# Altium footprint library Component.PcbLib: 47 footprints (part 1 of 3)
Each footprint in its own frame and in the unit in brackets; x right, y up, seen from the top. Pads: shape width x height; smd on the part's side, far side on the other; paste and mask are expansions set on the pad; w line width, h text height; cw(c..) or ccw(c..) is an arc to the next point about the centre after c.
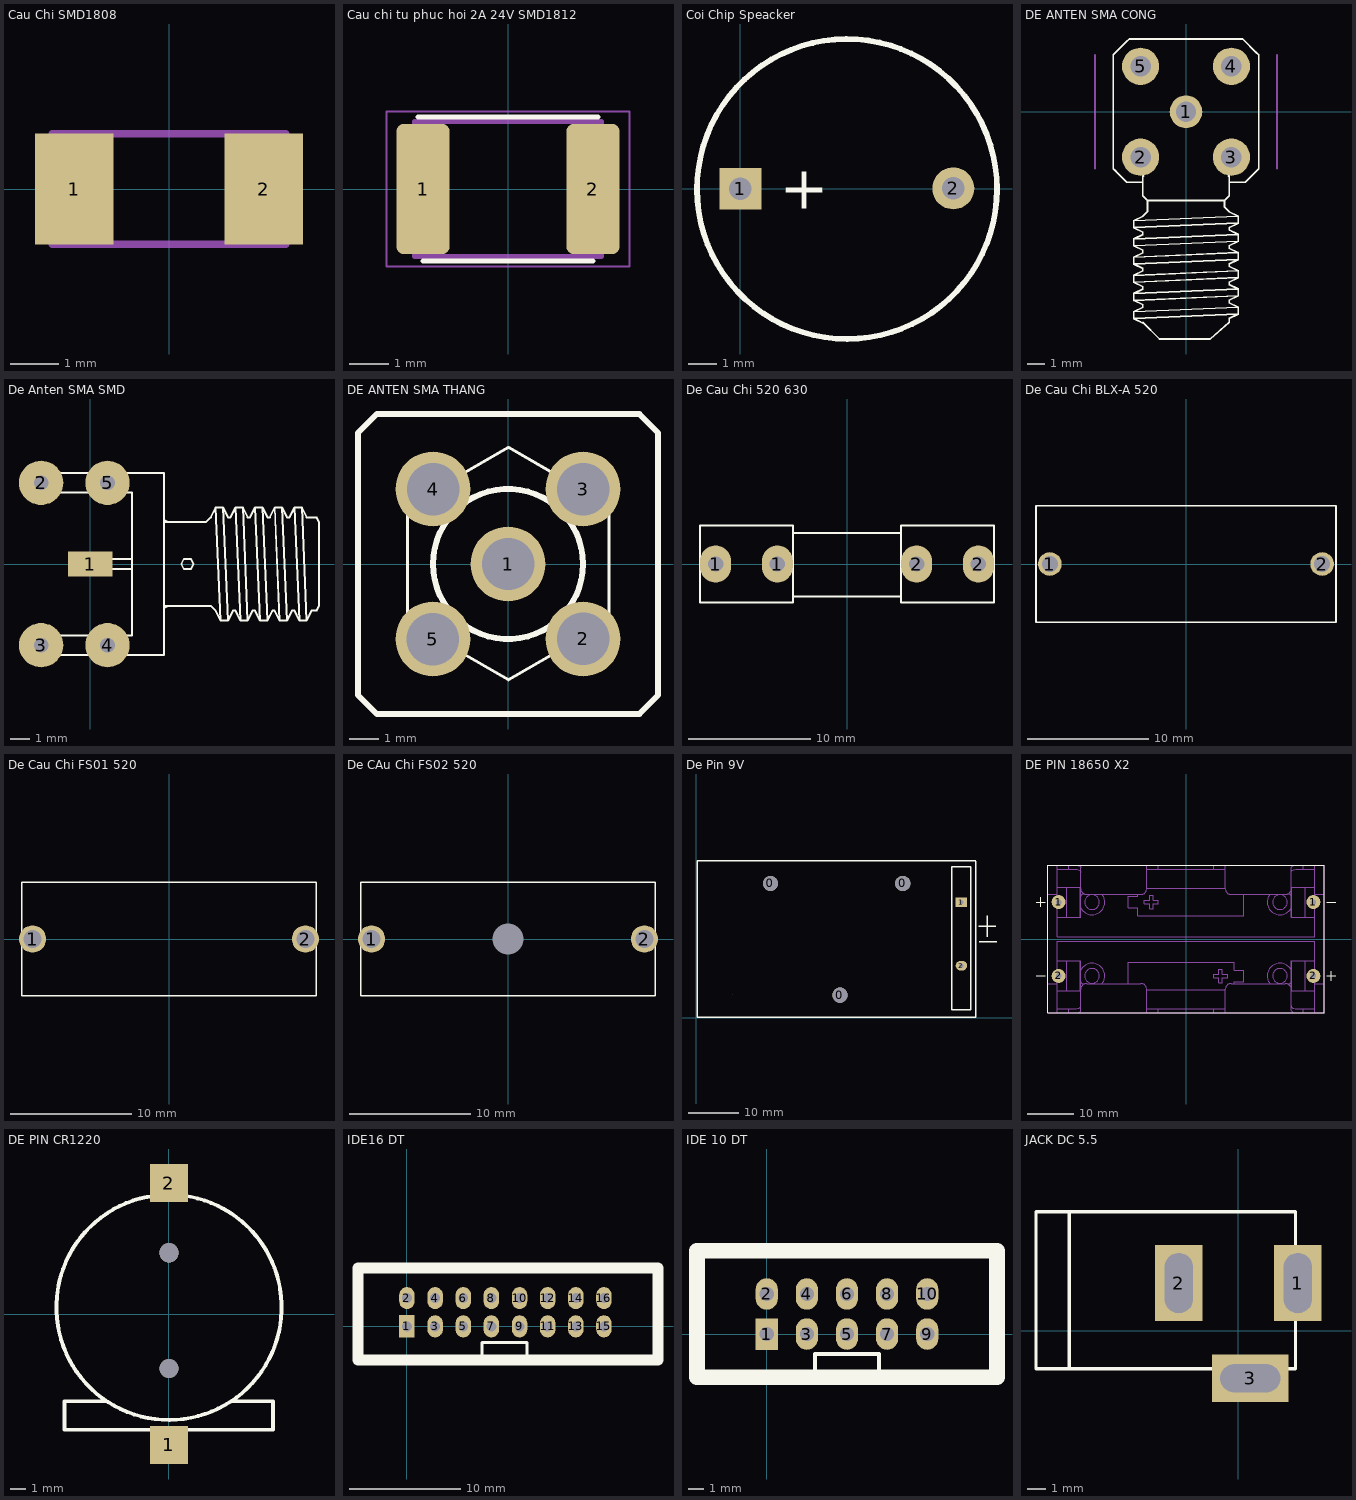
[diagram p0: the footprints below, top view; thin cyan lines are the x and y axes]

## Cau Chi SMD1808 [mil]
pads (2):
  rect 64x90 smd: 1(-77,0) 2(77,0)
Mechanical 13:
  lines w6: -55,-45 -55,45 ; -55,-45 -95,-45 -95,45 -55,45 ; -55,-45 55,-45 ; -55,45 55,45 ; 55,-45 55,45 ; 55,-45 95,-45 95,45 55,45
3D body "User Library-SMD Ceramic Capacitors_1808 (4520)_LF.STEP": height 39.37, standoff 0, extent -90.79,-39.36 90.8,39.38

## Cau chi tu phuc hoi 2A 24V SMD1812 [mm]
pads (2):
  rrect25% 1.34x3.29 smd: 1(-2.15,0) 2(2.15,0)
Top Overlay:
  lines w0.127: -2.28,1.825 2.28,1.825 ; -2.15,-1.825 2.15,-1.825
Mechanical 13:
  lines w0.127: -2.37,-1.71 2.37,-1.71 2.37,1.71 -2.37,1.71 -2.37,-1.71
Mechanical 15:
  lines w0.05: -3.07,-1.96 3.07,-1.96 3.07,1.96 -3.07,1.96 -3.07,-1.96
3D body "step_temp.STEP": height 1.25, standoff 0, extent -2.275,-1.62 2.275,1.62

## Coi Chip Speacker [mm]
pads (2):
  rect 1.5x1.5 hole 0.8: 1(0,0)
  round 1.5 hole 0.8: 2(7.62,0.013)
Top Overlay:
  lines w0.203: 7.724,3.67 ccw(c3.816,-0.008) 7.76,3.632
  text "+" at 1.41,-0.711 h1.52
3D body "User Library-Buzzer WST-1203UX.step": height 4.5, standoff -9.65, extent -2.215,-6 13.239,6

## DE ANTEN SMA CONG [mil]
pads (5):
  round 72 hole 45: 1(0,0)
  round 82 hole 45: 2(-100,-100) 3(100,-100) 4(100,100) 5(-100,100)
Top Overlay:
  lines w4: -155,-130 -160,-125 ; -95,-465 -115,-455 ; -95,-463.33 -58.33,-500 53.33,-500 95,-463.33 95,-455 115,-445 ; -95,-155 -130,-155 -160,-125 ; -93.33,-141.67 -95,-140 -95,-185 -85,-195 ; 93.33,-141.67 95,-140 95,-185 85,-195 ; 95,-155 130,-155 160,-125 160,80 ; 160,75 160,125 155,130 125,160 -125,160 -130,155 -160,125 -160,-125 ; -115,-455 -115,-440 ; -115,-455 115,-445 ; -115,-440 -95,-430 -95,-425 -115,-415 ; -115,-440 115,-430 ; -115,-415 -115,-400 ; -115,-415 115,-405 ; -115,-400 -95,-390 -95,-385 -115,-375 ; -115,-400 115,-390 ; -115,-375 -115,-360 ; -115,-375 115,-365 ; -115,-360 -95,-350 -95,-345 -115,-335 ; -115,-360 115,-350 ; -115,-335 -115,-320 ; -115,-335 115,-325 ; -115,-320 -95,-310 -95,-305 -115,-295 ; -115,-320 115,-310 ; -115,-295 -115,-280 ; -115,-295 115,-285 ; -115,-280 -95,-270 -95,-265 -115,-255 ; -115,-280 115,-270 ; -115,-255 -115,-240 ; -115,-255 115,-245 ; -115,-240 -95,-230 -85,-220 -85,-210 -85,-200 -85,-195 ; -115,-240 115,-230 ; -85,-195 85,-195 ; 85,-195 85,-200 85,-210 95,-220 115,-230 ; 115,-445 115,-430 ; 115,-430 95,-420 95,-415 115,-405 ; 115,-405 115,-390 ; 115,-390 95,-380 95,-375 115,-365 ; 115,-365 115,-350 ; 115,-350 95,-340 95,-335 115,-325 ; 115,-325 115,-310 ; 115,-310 95,-300 95,-295 115,-285 ; 115,-285 115,-270 ; 115,-270 95,-260 95,-255 115,-245 ; 115,-245 115,-230
Mechanical 1:
  lines w4: -200,-125 -200,125 ; 200,-125 200,125
3D body "SMA-J-P-X-RA-TH1.step": height 394.06, standoff -149.25, extent -136.5,-457.49 139.09,137

## De Anten SMA SMD [mil]
pads (5):
  rect 90x50 smd: 1(0,0)
  round 90 hole 30: 2(-100,165) 3(-100,-165) 4(35,-165) 5(35,165)
Top Overlay:
  lines w4: 10,-10 85,-10 ; 10,10 85,10 ; 150,-90 160,-85 ; 150,-85 200,-85 220,-85 225,-85 235,-85 245,-85 255,-95 265,-115 ; 150,85 200,85 220,85 225,85 235,85 245,95 255,115 ; 150,90 160,85 ; 255,115 270,115 ; 255,115 265,-115 ; 265,-115 280,-115 ; 270,115 280,95 285,95 ; 270,115 280,-115 ; 280,-115 290,-95 ; 285,95 295,115 ; 285,95 295,115 ; 290,-95 295,-95 ; 290,-95 295,-95 ; 295,-95 305,-115 ; 295,115 310,115 ; 295,115 305,-115 ; 305,-115 320,-115 ; 310,115 320,95 325,95 335,115 ; 310,115 320,-115 ; 320,-115 330,-95 335,-95 345,-115 ; 335,115 350,115 ; 335,115 345,-115 ; 345,-115 360,-115 ; 350,115 360,95 365,95 375,115 ; 350,115 360,-115 ; 360,-115 370,-95 375,-95 385,-115 ; 375,115 390,115 ; 375,115 385,-115 ; 385,-115 400,-115 ; 390,115 400,95 405,95 415,115 ; 390,115 400,-115 ; 400,-115 410,-95 415,-95 425,-115 ; 415,115 430,115 ; 415,115 425,-115 ; 425,-115 440,-115 ; 430,115 440,95 448.33,95 460,95 465,85 465,53.33 465,-58.33 465,-85 460,-95 450,-95 440,-115 ; 430,115 440,-115 ; -100,-185 -100,-145 85,-145 85,145 -100,145 -100,185 65,185 85,185 150,185 150,-185 -100,-185 ; 185,0 190,10 205,10 210,0 205,-10 190,-10 185,0
3D body "sma-endlaunch-wide.step": height 155.91, standoff -155.91, extent -103.24,-186 441.24,188.8

## DE ANTEN SMA THANG [mil]
pads (5):
  round 100 hole 70: 1(0,0) 2(100,-100) 3(100,100) 4(-100,100) 5(-100,-100)
Top Overlay:
  circle w8: c0,0 r100
  circle w8: c0,0 r25
  lines w4: -133.69,-76.91 -133.69,78.09 0.55,155.59 134.78,78.09 134.78,-76.91 0.55,-154.41 -133.69,-76.91
  lines w8: -200,-175 -175,-200 175,-200 200,-175 200,175 175,200 -175,200 -200,175 -200,150 -200,-175
3D body "SMA-J-P-X-ST-TH1.step": height 385.54, standoff -145.95, extent -138.3,-136.09 137.3,139.5

## De Cau Chi 520 630 [mil] "De Fuse"
pads (4):
  oval 100x120 hole 50: 1(-425,0) 1(-225,0) 2(225,0) 2(425,0)
Top Overlay:
  lines w7: -175,-105 175,-105 ; -175,100 175,100 ; -475,-125 -175,-125 -175,125 -475,125 -475,-125 ; 175,-125 175,125 475,125 475,-125 175,-125
3D body "SW3dPS-Fuse Leg_2009.STEP": height 377.88, standoff -129.94, extent -448,-117 -208,126.71
3D body "SW3dPS-Fuse Small 1A.STEP": height 370.39, standoff 169.61, extent -384.8,-98 390.8,102.79
3D body "SW3dPS-Fuse Leg_2009.STEP": height 377.88, standoff -129.94, extent 219,-116.71 459,127

## De Cau Chi BLX-A 520 [mm] "PCB - Clip Cover - THR"
height 12.6
pads (2):
  round 1.95 hole 1.3: 1(-11.25,0) 2(11.25,0)
Top Overlay:
  lines w0.127: -12.4,-4.8 12.4,-4.8 12.4,4.8 -12.4,4.8 -12.4,-4.8
3D body "696103201002.stp": height 25, standoff -4.1, extent -12.4,-4.8 12.4,4.8

## De Cau Chi FS01 520 [mm] "FUSEHOLDER BLOCKS - PCB - CLIP COVER - THT - WR-FSH"
height 11.5
pads (2):
  round 2.25 hole 1.5: 1(-11.3,0) 2(11.3,0)
Top Overlay:
  lines w0.127: -12.2,-4.7 12.2,-4.7 12.2,4.7 -12.2,4.7 -12.2,-4.7
3D body "696108003002.stp": height 23.72, standoff -3.48, extent -12.2,-4.7 12.2,4.7

## De CAu Chi FS02 520 [mm] "FUSEHOLDER BLOCKS - PCB - CLIP COVER - THT - WR-FSH"
height 11.5
pads (3):
  round 2.25 hole 1.5: 1(-11.3,0) 2(11.3,0)
  round 0 hole 2.6 unplated: ""(0,0)
Top Overlay:
  lines w0.127: -12.2,-4.7 12.2,-4.7 12.2,4.7 -12.2,4.7 -12.2,-4.7
3D body "696107003002.stp": height 23.72, standoff -3.48, extent -12.2,-4.7 12.2,4.7

## De Pin 9V [mil]
pads (5):
  round 120 hole 120: 0(581.4,1052.4) 0(1126.9,175.9) 0(1620.4,1052.5)
  rect 90x75 hole 34: 1(2080.5,905.75)
  oval 90x75 hole 34: 2(2080.5,407.05)
Top Overlay:
  lines w10: 2193,1230.1 4.6,1230.1 4.6,3.1 2193.73,3.1 2193.73,1226.56 ; 2216.7,717.5 2351,717.5 ; 2221,595 2360,595 ; 2284.6,635.6 2284.6,799.3 ; 2005.5,60 2005.5,1185 2155.5,1185 2155.5,60 2005.5,60
Mechanical 1:
  lines w10: 283.75,183.25 283.8,183.29
3D body "User Library-9V Duracell Battery-1.STEP": height 894.49, standoff 205.51, extent 140.78,88.65 2050.23,1131.96
3D body "User Library-PP3 9V battery holder.STEP": height 855.91, standoff 44.88, extent 27.27,19.55 2172.93,1210.5

## DE PIN 18650 X2 [mil] "2-cell AA battery holder"
height 660
pads (4):
  round 120 hole 48: 1(-1086.61,314.96) 1(1086.61,314.96) 2(-1086.61,-314.96) 2(1086.61,-314.96)
Top Overlay:
  lines w5: -1279.53,-314.96 -1200.79,-314.96 ; -1279.53,314.96 -1200.79,314.96 ; -1240.16,275.59 -1240.16,354.33 ; 1200.79,-314.96 1279.53,-314.96 ; 1200.79,314.96 1279.53,314.96 ; 1240.16,-354.33 1240.16,-275.59
  lines w7.87: -1181.1,-629.92 -1181.1,629.92 1181.1,629.92 1181.1,-629.92 -1181.1,-629.92
Mechanical 13:
  drawing of 198 lines, arcs and shapes, not listed
3D body "2xAA Battery Holder.STEP": height 657.48, standoff -118.11, extent -1181.1,-629.91 1181.1,629.93
3D body "User Library-Battery-AAA.STEP": height 595.47, standoff 191.93, extent -918.03,-470 828.03,-66.45
3D body "User Library-Battery-AAA.STEP": height 595.47, standoff 191.93, extent -958.03,55 788.03,458.55

## DE PIN CR1220 [mm]
pads (2):
  rect 2.5x2.5 smd: 1(0,-8.6) 2(0,8.6)
via 0.005,-3.579 diameter 1.27 hole 1.27
via 0,4.026 diameter 1.27 hole 1.27
Top Overlay:
  lines w0.254: -4.194,-5.725 -6.868,-5.725 -6.868,-7.6 6.833,-7.6 6.833,-5.725 4.158,-5.725 ; -0.038,7.836 ccw(c0.005,0.439) 0,7.836
3D body "CR1220 SMD.STEP": height 4.27, standoff -0.48, extent -7.389,-9.42 7.36,9.38

## IDE16 DT [mm]
pads (16):
  rect 1.4x2 hole 0.9: 1(0,0)
  oval 1.4x2 hole 0.9: 2(0,2.54) 3(2.54,0) 4(2.54,2.54) 5(5.08,0) 6(5.08,2.54) 7(7.62,0) 8(7.62,2.54) 9(10.16,0) 10(10.16,2.54) 11(12.7,0) 12(12.7,2.54) 13(15.24,0) 14(15.24,2.54) 15(17.78,0) 16(17.78,2.54)
Top Overlay:
  lines w0.254: 6.782,-2.718 6.782,-1.448 10.846,-1.448 10.846,-2.972
  lines w1: 8.28,-3.048 22.657,-3.048 22.657,5.27 8.28,5.27 ; 14.58,-3.048 -4.42,-3.048 -4.42,5.27 14.58,5.27

## IDE 10 DT [mm] "Connector; Header; 5x2 Position"
pads (10):
  rect 1.4x2 hole 0.9: 1(0,0)
  oval 1.4x2 hole 0.9: 2(0,2.54) 3(2.54,0) 4(2.54,2.54) 5(5.08,0) 6(5.08,2.54) 7(7.62,0) 8(7.62,2.54) 9(10.16,0) 10(10.16,2.54)
Top Overlay:
  lines w0.254: 3.048,-2.286 3.048,-1.27 6.858,-1.27 7.112,-1.27 7.112,-2.286
  lines w1: -4.42,-2.73 -4.42,5.27 14.58,5.27 14.58,-2.73 -4.42,-2.73
3D body "User Library-Tyco - 5103308-1 (Shrouded Header 2_54mm 10 Pin).step": height 9.86, standoff -3.05, extent -5.08,-3.302 15.24,5.842

## JACK DC 5.5 [mm] "Jac DC input"
height 5.08
pads (3):
  rect 2.54x4.064 hole 1.5 slot 3.2 at 90 deg: 1(3.175,2.54) 2(-3.175,2.54)
  rect 4.064x2.54 hole 1.5 slot 3.2 at 0 deg: 3(0.635,-2.54)
Top Overlay:
  lines w0.178: -9.017,-2.032 -9.017,6.35 ; -10.795,-2.032 -10.795,6.35 3.048,6.35 3.048,-2.032 -10.795,-2.032
3D body "SW3dPS-dc range - dc connector[4840.2201].STEP": height 11.02, standoff -3.48, extent -10.423,-2.67 3.404,6.836